# Altium integrated library Cap-Cer-SMD_V2.IntLib: 957 symbols (part 3 of 7) (continued)
## 10nF_0805N_50V_5%_C0G/NP0
designator C?, comment value 10nF  Voltage: 50V  Text1: 0805  (hidden comment: 10nF_C0805_50V_5%_C0G/NP0)
Cap Ceramic C0G/NP0; Manufacturer: Various; Part Number: 10nF 0805 50V 5% C0G/NP0; Tol: 5%; Package: CAPC0805X110N; EDM-PN: *; Text2: *; SAAB PN: *; DCE Part No: *
footprint CAPC0805X110N (Chip Capacitor, 0805, 2-Leads, Body 2.0x1.3mm, IPC Medium Density)
pins: 1, 2

## 10nF_0805N_50V_10%_X7R
designator C?, comment value 10nF  Voltage: 50V  Text1: 0805  (hidden comment: 10nF_C0805_50V_10%_X7R)
Cap Ceramic X7R; Manufacturer: Various; Part Number: 10nF 0805 50V 10% X7R; EDM-PN: CAP5; Tol: 10%; Package: CAPC0805X110N; Text2: *; SAAB PN: *; DCE Part No: *
footprint CAPC0805X110N (Chip Capacitor, 0805, 2-Leads, Body 2.0x1.3mm, IPC Medium Density)
pins: 1, 2

## 10nF_0805N_50V_10%_X7R-DNF
designator C?, comment value (10nF)  Voltage: 50V  Text1: 0805  (hidden comment: 10nF_C0805_50V_10%_X7R)
Cap Ceramic X7R - Do not Fit; Manufacturer: Various; Part Number: DNF - 10nF 0805 50V 10% X7R; EDM-PN: CAP5; Tol: 10%; Package: CAPC0805X110N; Text2: *; SAAB PN: *; DCE Part No: *
footprint CAPC0805X110N (Chip Capacitor, 0805, 2-Leads, Body 2.0x1.3mm, IPC Medium Density)
pins: 1, 2

## 10nF_0805N_100V_5%_C0G/NP0
designator C?, comment value 10nF  Voltage: 100V  Text1: 0805  (hidden comment: 10nF_C0805_100V_5%_C0G/NP0)
Cap Ceramic C0G/NP0; Manufacturer: Various; Part Number: 10nF 0805 100V 5% C0G/NP0; Tol: 5%; Package: CAPC0805X110N; EDM-PN: *; Text2: *; Reutech PN: *; SAAB PN: *; DCE Part No: *
footprint CAPC0805X110N (Chip Capacitor, 0805, 2-Leads, Body 2.0x1.3mm, IPC Medium Density)
pins: 1, 2

## 10nF_0805N_100V_10%_X7R
designator C?, comment value 10nF  Voltage: 100V  Text1: 0805  (hidden comment: 10nF_C0805_100V_10%_X7R)
Cap Ceramic X7R; Manufacturer: Various; Part Number: 10nF 0805 100V 10% X7R; EDM-PN: CAP994; Tol: 10%; Reutech PN: 5910-CA-0560; SAAB PN: 1AAB00129AEA; Package: CAPC0805X110N; Text2: *; DCE Part No: *
footprint CAPC0805X110N (Chip Capacitor, 0805, 2-Leads, Body 2.0x1.3mm, IPC Medium Density)
pins: 1, 2

## 10nF_0805N_250V_10%_X7R
designator C?, comment value 10nF  Voltage: 250V  Text1: 0805  (hidden comment: 10nF_C0805_250V_10%_X7R)
Cap Ceramic X7R; Manufacturer: Various; Part Number: 10nF 0805 250V 10% X7R; Tol: 10%; Package: CAPC0805X110N; EDM-PN: *; Text2: *; SAAB PN: *; DCE Part No: *
footprint CAPC0805X110N (Chip Capacitor, 0805, 2-Leads, Body 2.0x1.3mm, IPC Medium Density)
pins: 1, 2

## 10nF_0805N_500V_10%_X7R
designator C?, comment value 10nF  Voltage: 500V  Text1: 0805  (hidden comment: 10nF_C0805_500V_10%_X7R)
Cap Ceramic X7R; Manufacturer: Various; Part Number: 10nF 0805 500V 10% X7R; Tol: 10%; Package: CAPC0805X110N; EDM-PN: *; Text2: *; SAAB PN: *; DCE Part No: *
footprint CAPC0805X110N (Chip Capacitor, 0805, 2-Leads, Body 2.0x1.3mm, IPC Medium Density)
pins: 1, 2

## 10nF_1206N_50V_10%_X7R
designator C?, comment value 10nF  Voltage: 50V  Text1: 1206  (hidden comment: 10nF_C1206_50V_10%_X7R)
Cap Ceramic X7R; Manufacturer: Various; Part Number: 10nF 1206 50V 10% X7R; Tol: 10%; Package: CAPC1206X135N; EDM-PN: *; Text2: *; SAAB PN: *; DCE Part No: *
footprint CAPC1206X135N (Chip Capacitor, 1206, 2-Leads, Body 3.2x1.6mm, IPC Medium Density)
pins: 1, 2

## 10nF_1206N_500V_10%_X7R
designator C?, comment value 10nF  Voltage: 500V  Text1: 1206  (hidden comment: 10nF_C1206_500V_10%_X7R)
Cap Ceramic X7R; Manufacturer: Various; Part Number: 10nF 1206 500V 10% X7R; Tol: 10%; Package: CAPC1206X135N; EDM-PN: *; Text2: *; SAAB PN: *; DCE Part No: *
footprint CAPC1206X135N (Chip Capacitor, 1206, 2-Leads, Body 3.2x1.6mm, IPC Medium Density)
pins: 1, 2

## 10nF_1210N_1kV_10%_X7R
designator C?, comment value 10nF  Voltage: 1kV  Text1: 1210  (hidden comment: 10nF_C1210_1kV_10%_X7R)
Cap Ceramic X7R; Manufacturer: Various; Part Number: 10nF 1210 1kV 10% X7R; Tol: 10%; Package: CAPC1210X180N; EDM-PN: *; Text2: *; SAAB PN: *; DCE Part No: *
footprint CAPC1210X180N (Chip Capacitor, 1210, 2-Leads, Body 3.2x2.5mm, IPC Medium Density)
pins: 1, 2

## 10nF_1808N_500V_10%_X7R
designator C?, comment value 10nF  Voltage: 500V  Text1: 1808  (hidden comment: 10nF_C1808_500V_10%_X7R)
Cap Ceramic X7R; Manufacturer: Various; Part Number: 10nF 1808 500V 10% X7R; Tol: 10%; Package: CAPC1808X155N; EDM-PN: *; Text2: *; SAAB PN: *; DCE Part No: *
footprint CAPC1808X155N (Chip Capacitor, 1808, 2-Leads, Body 4.7x2.0mm, IPC Medium Density)
pins: 1, 2

## 10nF_1812N_1kV_10%_X7R
designator C?, comment value 10nF  Voltage: 1kV  Text1: 1812  (hidden comment: 10nF_C1812_1kV_10%_X7R)
Cap Ceramic X7R; Manufacturer: Various; Part Number: 10nF 1812 1kV 10% X7R; Tol: 10%; Package: CAPC1812X135N; EDM-PN: *; Text2: *; SAAB PN: *; DCE Part No: *
footprint CAPC1812X135N (Chip Capacitor, 1812, 2-Leads, Body 4.5x3.2mm, IPC Medium Density)
pins: 1, 2

## 10nF_1812N_500V_10%_X7R
designator C?, comment value 10nF  Voltage: 500V  Text1: 1812  (hidden comment: 10nF_C1812_500V_10%_X7R)
Cap Ceramic X7R; Manufacturer: Various; Part Number: 10nF 1812 500V 10% X7R; Tol: 10%; Package: CAPC1812X135N; EDM-PN: *; Text2: *; SAAB PN: *; DCE Part No: *
footprint CAPC1812X135N (Chip Capacitor, 1812, 2-Leads, Body 4.5x3.2mm, IPC Medium Density)
pins: 1, 2

## 10pF_0201N_25V_5%_C0G/NP0
designator C?, comment value 10pF  Voltage: 25V  Text1: 0201  (hidden comment: 10pF_C0201_25V_5%_C0G/NP0)
Cap Ceramic C0G/NP0; Manufacturer: Various; Part Number: 10pF 0201 25V 5%_C0G/NP0; Tol: 5%; Package: CAPC0201X33N; EDM-PN: *; Text2: *; SAAB PN: *; DCE Part No: *
footprint CAPC0201X33N (Chip Capacitor, 0201, 2-Leads, Body 0.6x0.3mm, IPC Medium Density)
pins: 1, 2

## 10pF_0201N_50V_5%_C0G/NP0
designator C?, comment value 10pF  Voltage: 50V  Text1: 0201  (hidden comment: 10pF_C0201_50V_5%_C0G/NP0)
Cap Ceramic C0G/NP0; Manufacturer: Various; Part Number: 10pF 0201 50V 5%_C0G/NP0; Tol: 5%; Package: CAPC0201X33N; EDM-PN: *; Text2: *; SAAB PN: *; DCE Part No: *
footprint CAPC0201X33N (Chip Capacitor, 0201, 2-Leads, Body 0.6x0.3mm, IPC Medium Density)
pins: 1, 2

## 10pF_0402L_50V_5%_C0G/NP0
designator C?, comment value 10pF  Voltage: 50V  Text1: 0402  (hidden comment: 10pF_C0402_50V_5%_C0G/NP0)
Cap Ceramic C0G/NP0; Manufacturer: Various; Part Number: 10pF 0402 50V 5% C0G/NP0; EDM-PN: CAP1008; Tol: 5%; Package: CAPC0402X60L; Text2: *; SAAB PN: *; DCE Part No: *
footprint CAPC0402X60L (Chip Capacitor, 0402, 2-Leads, Body 1.0x0.5mm, IPC High Density)
pins: 1, 2

## 10pF_0402N_50V_1%_C0G/NP0-GRM1555C
designator C?, comment value 10pF  Voltage: 50V  Text1: 0402  (hidden comment: GRM1555C1H100FA01D)
Cap Ceramic C0G/NP0; Manufacturer: Murata; Tol: 1%; Part Number: GRM1555C1H100FA01D; Package: GRM155-0.20; EDM-PN: *; Text2: *; SAAB PN: *; DCE Part No: *
footprint GRM155-0.20 (GRM155 0402 1.0x0.5mm)
pins: 1, 2

## 10pF_0402N_50V_5%_C0G/NP0
designator C?, comment value 10pF  Voltage: 50V  Text1: 0402  (hidden comment: 10pF_C0402_50V_5%_C0G/NP0)
Cap Ceramic C0G/NP0; Manufacturer: Various; Part Number: 10pF 0402 50V 5% C0G/NP0; EDM-PN: CAP1008; Tol: 5%; Package: CAPC0402X60N; Text2: *; SAAB PN: *; DCE Part No: *
footprint CAPC0402X60N (Chip Capacitor, 0402, 2-Leads, Body 1.0x0.5mm, IPC Medium Density)
pins: 1, 2

## 10pF_0402N_50V_10%_C0G/NP0
designator C?, comment value 10pF  Voltage: 50V  Text1: 0402  (hidden comment: 10pF_C0402_50V_10%_C0G/NP0)
Cap Ceramic C0G/NP0; Manufacturer: Various; Part Number: 10pF 0402 50V 10% C0G/NP0; DCE Part No: 7194; EDM-PN: CAP602; Tol: 10%; Package: CAPC0402X60N; Text2: *; SAAB PN: *
footprint CAPC0402X60N (Chip Capacitor, 0402, 2-Leads, Body 1.0x0.5mm, IPC Medium Density)
pins: 1, 2

## 10pF_0603N_50V_5%_C0G/NP0
designator C?, comment value 10pF  Voltage: 50V  Text1: 0603  (hidden comment: 10pF_C0603_50V_5%_C0G/NP0)
Cap Ceramic C0G/NP0; Manufacturer: Various; Part Number: 10pF 0603 50V 5% C0G/NP0; EDM-PN: CAP85; Tol: 5%; Package: CAPC0603X85N; Text2: *; SAAB PN: *; DCE Part No: *
footprint CAPC0603X85N (Chip Capacitor, 0603, 2-Leads, Body 1.6x0.8mm, IPC Medium Density)
pins: 1, 2

## 10pF_0603N_100V_5%_C0G/NP0
designator C?, comment value 10pF  Voltage: 100V  Text1: 0603  (hidden comment: 10pF_C0603_100V_5%_C0G/NP0)
Cap Ceramic C0G/NP0; Manufacturer: Various; Part Number: 10pF 0603 100V 5% C0G/NP0; Tol: 5%; Package: CAPC0603X85N; EDM-PN: *; Text2: *; SAAB PN: *; DCE Part No: *
footprint CAPC0603X85N (Chip Capacitor, 0603, 2-Leads, Body 1.6x0.8mm, IPC Medium Density)
pins: 1, 2

## 10pF_0805N_50V_5%_C0G/NP0
designator C?, comment value 10pF  Voltage: 50V  Text1: 0805  (hidden comment: 10pF_C0805_50V_5%_C0G/NP0)
Cap Ceramic C0G/NP0; Manufacturer: Various; Part Number: 10pF 0805 50V 5% C0G/NP0; Tol: 5%; Package: CAPC0805X110N; EDM-PN: *; Text2: *; SAAB PN: *; DCE Part No: *
footprint CAPC0805X110N (Chip Capacitor, 0805, 2-Leads, Body 2.0x1.3mm, IPC Medium Density)
pins: 1, 2

## 10pF_0805N_50V_5%_C0G/NP0-DNF
designator C?, comment value (10pF)  Voltage: 50V  Text1: 0805  (hidden comment: 10pF_C0805_50V_5%_C0G/NP0)
Cap Ceramic NP0 - Do not Fit; Manufacturer: Various; Part Number: DNF - 10pF 0805 50V 5% C0G/NP0; Tol: 5%; Package: CAPC0805X110N; EDM-PN: *; Text2: *; SAAB PN: *; DCE Part No: *
footprint CAPC0805X110N (Chip Capacitor, 0805, 2-Leads, Body 2.0x1.3mm, IPC Medium Density)
pins: 1, 2

## 10pF_0805N_100V_5%_C0G/NP0
designator C?, comment value 10pF  Voltage: 100V  Text1: 0805  (hidden comment: 10pF_C0805_100V_5%_C0G/NP0)
Cap Ceramic C0G/NP0; Manufacturer: Various; Part Number: 10pF 0805 100V 5% C0G/NP0; Tol: 5%; Package: CAPC0805X110N; EDM-PN: *; Text2: *; SAAB PN: *; DCE Part No: *
footprint CAPC0805X110N (Chip Capacitor, 0805, 2-Leads, Body 2.0x1.3mm, IPC Medium Density)
pins: 1, 2

## 10pF_0805N_630V_10%_X7R
designator C?, comment value 10pF  Voltage: 630V  Text1: 0805  (hidden comment: 10pF_C0805_630V_10%_X7R)
Cap Ceramic X7R; Manufacturer: Various; Part Number: 10pF 0805 630V 10% X7R; Tol: 10%; Package: CAPC0805X110N; EDM-PN: *; Text2: *; SAAB PN: *; DCE Part No: *
footprint CAPC0805X110N (Chip Capacitor, 0805, 2-Leads, Body 2.0x1.3mm, IPC Medium Density)
pins: 1, 2

## 10pF_0805N_630V_10%_X7R-DNF
designator C?, comment value (10pF)  Voltage: 630V  Text1: 0805  (hidden comment: 10pF_C0805_630V_10%_X7R-DNF)
Cap Ceramic X7R - Do not Fit; Manufacturer: Various; Part Number: DNF - 10pF 0805 630V 10% X7R; Tol: 10%; Package: CAPC0805X110N; EDM-PN: *; Text2: *; SAAB PN: *; DCE Part No: *
footprint CAPC0805X110N (Chip Capacitor, 0805, 2-Leads, Body 2.0x1.3mm, IPC Medium Density)
pins: 1, 2

## 10uF_0402N_6.3V_20%_X5R
designator C?, comment value 10uF  Voltage: 6.3V  Text1: 0402  (hidden comment: 10uF_C0402_6.3V_20%_X5R)
Cap Ceramic X5R; Manufacturer: Various; Part Number: 10uF 0402 6.3V 20% X5R; DCE Part No: 9490; Tol: 20%; Package: CAPC0402X60N; EDM-PN: *; Text2: *; SAAB PN: *
footprint CAPC0402X60N (Chip Capacitor, 0402, 2-Leads, Body 1.0x0.5mm, IPC Medium Density)
pins: 1, 2

## 10uF_0402N_10V_20%_X5R
designator C?, comment value 10uF  Voltage: 10V  Text1: 0402  (hidden comment: 10uF_C0402_10V_20%_X5R)
Cap Ceramic X5R; Manufacturer: Various; Part Number: 10uF 0402 10V 20% X5R; EDM-PN: CAP803; Tol: 20%; Package: CAPC0402X60N; Text2: *; SAAB PN: *; DCE Part No: *
footprint CAPC0402X60N (Chip Capacitor, 0402, 2-Leads, Body 1.0x0.5mm, IPC Medium Density)
pins: 1, 2

## 10uF_0603N_6.3V_10%_X5R
designator C?, comment value 10uF  Voltage: 6.3V  Text1: 0603  (hidden comment: 10uF_C0603_6.3V_10%_X5R)
Cap Ceramic X5R; Manufacturer: Various; Part Number: 10uF 0603 6.3V 10% X5R; EDM-PN: CAP605; Tol: 10%; Package: CAPC0603X85N; Text2: *; SAAB PN: *; DCE Part No: *
footprint CAPC0603X85N (Chip Capacitor, 0603, 2-Leads, Body 1.6x0.8mm, IPC Medium Density)
pins: 1, 2

## 10uF_0603N_6.3V_10%_X5R-GRM188
designator C?, comment value 10uF  Voltage: 6.3V  Text1: 0603  (hidden comment: 10uF_C0603_6.3V_10%_GRM188)
Cap Ceramic X5R; Manufacturer: Murata; Part Number: GRM188R60J106M; Tol: 10%; Package: CAPC0603X85N; EDM-PN: *; Text2: *; SAAB PN: *; DCE Part No: *
footprint CAPC0603X85N (Chip Capacitor, 0603, 2-Leads, Body 1.6x0.8mm, IPC Medium Density)
pins: 1, 2

## 10uF_0603N_6.3V_20%_X5R
designator C?, comment value 10uF  Voltage: 6.3V  Text1: 0603  (hidden comment: 10uF_C0603_6.3V_20%_X5R)
Cap Ceramic X5R; Manufacturer: Various; Part Number: 10uF 0603 6.3V 20% X5R; Tol: 20%; Package: CAPC0603X85N; EDM-PN: *; Text2: *; SAAB PN: *; DCE Part No: *
footprint CAPC0603X85N (Chip Capacitor, 0603, 2-Leads, Body 1.6x0.8mm, IPC Medium Density)
pins: 1, 2

## 10uF_0603N_6.3V_20%_X5R-GRM188R60J106ME47D
designator C?, comment value 10uF  Voltage: 6.3V  Text1: 0603  (hidden comment: GRM188R60J106ME47D)
Cap Ceramic X5R; Manufacturer: Murata; Tol: 20%; Part Number: GRM188R60J106ME47D; Package: CAPC0603X85N; EDM-PN: *; Text2: *; SAAB PN: *; DCE Part No: *
footprint CAPC0603X85N (Chip Capacitor, 0603, 2-Leads, Body 1.6x0.8mm, IPC Medium Density)
pins: 1, 2

## 10uF_0603N_10V_10%_X5R
designator C?, comment value 10uF  Voltage: 10V  Text1: 0603  (hidden comment: 10uF_C0603_10V_10%_X5R)
Cap Ceramic X5R; Manufacturer: Various; Part Number: 10uF 0603 10V 10% X5R; EDM-PN: CAP605; Tol: 10%; Reutech PN: 5910-CA-0521; Package: CAPC0603X85N; Text2: *; SAAB PN: *; DCE Part No: *
footprint CAPC0603X85N (Chip Capacitor, 0603, 2-Leads, Body 1.6x0.8mm, IPC Medium Density)
pins: 1, 2

## 10uF_0603N_16V_20%_X5R
designator C?, comment value 10uF  Voltage: 16V  Text1: 0603  (hidden comment: 10uF_C0603_16V_20%_X5R)
Cap Ceramic X5R; Manufacturer: Various; Part Number: 10uF 0603 16V 20% X5R; EDM-PN: CAP655; Tol: 20%; Package: CAPC0603X85N; Text2: *; SAAB PN: *; DCE Part No: *
footprint CAPC0603X85N (Chip Capacitor, 0603, 2-Leads, Body 1.6x0.8mm, IPC Medium Density)
pins: 1, 2

## 10uF_0603N_16V_20%_X5R-DNF
designator C?, comment value (10uF)  Voltage: 16V  Text1: 0603  (hidden comment: 10uF_C0603_16V_20%_X5R-DNF)
Cap Ceramic X5R - Do not Fit; Manufacturer: Various; Part Number: DNF - 10uF 0603 16V 16% X5R; Tol: 20%; Package: CAPC0603X85N; EDM-PN: *; Text2: *; SAAB PN: *; DCE Part No: *
footprint CAPC0603X85N (Chip Capacitor, 0603, 2-Leads, Body 1.6x0.8mm, IPC Medium Density)
pins: 1, 2

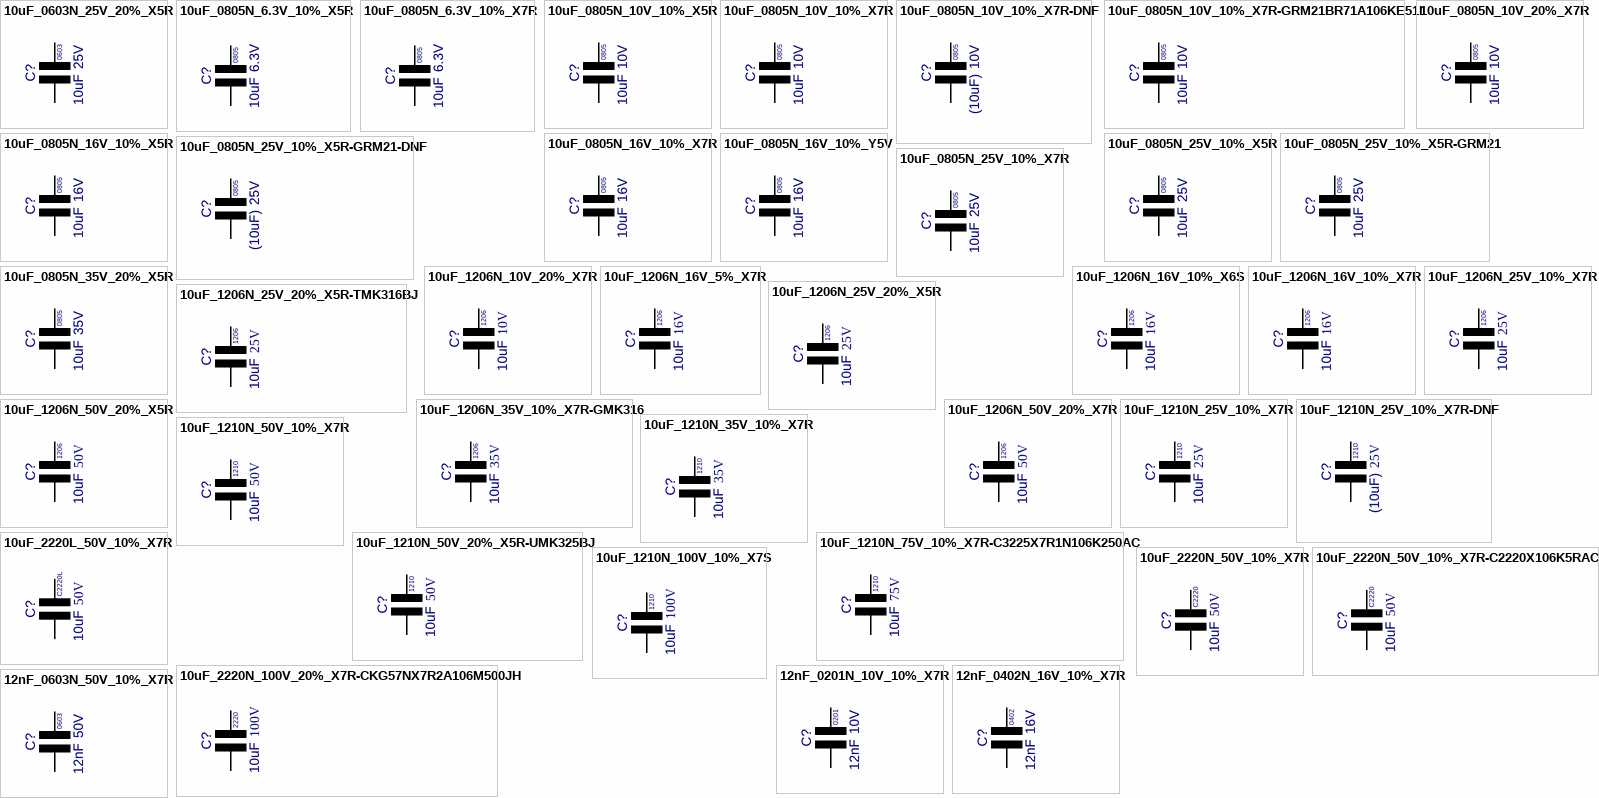
[diagram p10: symbols 10uF_0603N_25V_20%_X5R to 12nF_0603N_50V_10%_X7R]

## 10uF_0603N_25V_20%_X5R
designator C?, comment value 10uF  Voltage: 25V  Text1: 0603  (hidden comment: 10uF_C0603_25V_20%_X5R)
Cap Ceramic X5R; Manufacturer: Various; Part Number: 10uF 0603 25V 20% X5R; EDM-PN: CAP809; Tol: 20%; Package: CAPC0603X85N; Text2: *; SAAB PN: *; DCE Part No: *
footprint CAPC0603X85N (Chip Capacitor, 0603, 2-Leads, Body 1.6x0.8mm, IPC Medium Density)
pins: 1, 2

## 10uF_0805N_6.3V_10%_X5R
designator C?, comment value 10uF  Voltage: 6.3V  Text1: 0805  (hidden comment: 10uF_C0805_6.3V_10%_X5R)
Cap Ceramic X5R; Manufacturer: Various; Part Number: 10uF 0805 6.3V 10% X5R; Tol: 10%; Package: CAPC0805X110N; EDM-PN: *; Text2: *; SAAB PN: *; DCE Part No: *
footprint CAPC0805X110N (Chip Capacitor, 0805, 2-Leads, Body 2.0x1.3mm, IPC Medium Density)
pins: 1, 2

## 10uF_0805N_6.3V_10%_X7R
designator C?, comment value 10uF  Voltage: 6.3V  Text1: 0805  (hidden comment: 10uF_C0805_6.3V_10%_X7R)
Cap Ceramic X7R; Manufacturer: Various; Part Number: 10uF 0805 6.3V 10% X7R; Tol: 10%; Package: CAPC0805X110N; EDM-PN: *; Text2: *; SAAB PN: *; DCE Part No: *
footprint CAPC0805X110N (Chip Capacitor, 0805, 2-Leads, Body 2.0x1.3mm, IPC Medium Density)
pins: 1, 2

## 10uF_0805N_10V_10%_X5R
designator C?, comment value 10uF  Voltage: 10V  Text1: 0805  (hidden comment: 10uF_C0805_10V_10%_X5R)
Cap Ceramic X5R; Manufacturer: Various; Part Number: 10uF 0805 10V 10% X5R; EDM-PN: CAP302; Tol: 10%; Package: CAPC0805X110N; Text2: *; SAAB PN: *; DCE Part No: *
footprint CAPC0805X110N (Chip Capacitor, 0805, 2-Leads, Body 2.0x1.3mm, IPC Medium Density)
pins: 1, 2

## 10uF_0805N_10V_10%_X7R
designator C?, comment value 10uF  Voltage: 10V  Text1: 0805  (hidden comment: 10uF_C0805_10V_10%_X7R)
Cap Ceramic X7R; Manufacturer: Various; Part Number: 10uF 0805 10V 10% X7R; EDM-PN: CAP302; Tol: 10%; Package: CAPC0805X110N; Text2: *; SAAB PN: *; DCE Part No: *
footprint CAPC0805X110N (Chip Capacitor, 0805, 2-Leads, Body 2.0x1.3mm, IPC Medium Density)
pins: 1, 2

## 10uF_0805N_10V_10%_X7R-DNF
designator C?, comment value (10uF)  Voltage: 10V  Text1: 0805  (hidden comment: 10uF_C0805_10V_10%_X7R-DNF)
Cap Ceramic X7R - Do not Fit; Manufacturer: Various; Part Number: DNF - 10uF 0805 10V 10% X7R; EDM-PN: CAP302; Tol: 10%; Package: CAPC0805X110N; Text2: *; SAAB PN: *; DCE Part No: *
footprint CAPC0805X110N (Chip Capacitor, 0805, 2-Leads, Body 2.0x1.3mm, IPC Medium Density)
pins: 1, 2

## 10uF_0805N_10V_10%_X7R-GRM21BR71A106KE51L
designator C?, comment value 10uF  Voltage: 10V  Text1: 0805  (hidden comment: GRM21BR71A106KE51L)
Cap Ceramic X7R; Manufacturer: Murata; Tol: 10%; Part Number: GRM21BR71A106KE51L; Package: CAPC0805X110N; EDM-PN: *; Text2: *; SAAB PN: *; DCE Part No: *
footprint CAPC0805X110N (Chip Capacitor, 0805, 2-Leads, Body 2.0x1.3mm, IPC Medium Density)
pins: 1, 2

## 10uF_0805N_10V_20%_X7R
designator C?, comment value 10uF  Voltage: 10V  Text1: 0805  (hidden comment: 10uF_C0805_10V_20%_X7R)
Cap Ceramic X7R; Manufacturer: Various; Part Number: 10uF 0805 10V 20% X7R; EDM-PN: CAP302; Tol: 20%; Package: CAPC0805X110N; Text2: *; SAAB PN: *; DCE Part No: *
footprint CAPC0805X110N (Chip Capacitor, 0805, 2-Leads, Body 2.0x1.3mm, IPC Medium Density)
pins: 1, 2

## 10uF_0805N_16V_10%_X5R
designator C?, comment value 10uF  Voltage: 16V  Text1: 0805  (hidden comment: 10uF_C0805_16V_10%_X5R)
Cap Ceramic X5R; Manufacturer: Various; Part Number: 10uF 0805 16V 10% X5R; EDM-PN: CAP588; Tol: 10%; Package: CAPC0805X110N; Text2: *; SAAB PN: *; DCE Part No: *
footprint CAPC0805X110N (Chip Capacitor, 0805, 2-Leads, Body 2.0x1.3mm, IPC Medium Density)
pins: 1, 2

## 10uF_0805N_16V_10%_X7R
designator C?, comment value 10uF  Voltage: 16V  Text1: 0805  (hidden comment: 10uF_C0805_16V_10%_X7R)
Cap Ceramic X7R; Manufacturer: Various; Part Number: 10uF 0805 16V 10% X7R; Tol: 10%; Package: CAPC0805X110N; EDM-PN: *; Text2: *; SAAB PN: *; DCE Part No: *
footprint CAPC0805X110N (Chip Capacitor, 0805, 2-Leads, Body 2.0x1.3mm, IPC Medium Density)
pins: 1, 2

## 10uF_0805N_16V_10%_Y5V
designator C?, comment value 10uF  Voltage: 16V  Text1: 0805  (hidden comment: 10uF_C0805_16V_10%_Y5V)
Cap Ceramic Y5V; Manufacturer: Various; Part Number: 10uF 0805 16V 10% Y5V; EDM-PN: CAP588; Tol: 10%; Package: CAPC0805X135N; Text2: *; SAAB PN: *; DCE Part No: *
footprint CAPC0805X135N (Chip Capacitor, 0805, 2-Leads, Body 2.0x1.3mm, IPC Medium Density)
pins: 1, 2

## 10uF_0805N_25V_10%_X5R
designator C?, comment value 10uF  Voltage: 25V  Text1: 0805  (hidden comment: 10uF_C0805_25V_10%_X5R)
Cap Ceramic X5R; Manufacturer: Various; Part Number: 10uF 0805 25V 10% X5R; EDM-PN: CAP566; Tol: 10%; Package: CAPC0805X110N; Text2: *; SAAB PN: *; DCE Part No: *
footprint CAPC0805X110N (Chip Capacitor, 0805, 2-Leads, Body 2.0x1.3mm, IPC Medium Density)
pins: 1, 2

## 10uF_0805N_25V_10%_X5R-GRM21
designator C?, comment value 10uF  Voltage: 25V  Text1: 0805  (hidden comment: 10uF_C0805_25V_10%_X5R-GRM21)
Cap Ceramic X5R; Manufacturer: Murata; Part Number: GRM21BR61E106KA73L; EDM-PN: CAP566; Tol: 10%; Package: CAPC0805X135N; Text2: *; SAAB PN: *; DCE Part No: *
footprint CAPC0805X135N (Chip Capacitor, 0805, 2-Leads, Body 2.0x1.3mm, IPC Medium Density)
pins: 1, 2

## 10uF_0805N_25V_10%_X5R-GRM21-DNF
designator C?, comment value (10uF)  Voltage: 25V  Text1: 0805  (hidden comment: 10uF_C0805_25V_10%_X5R-GRM21)
Cap Ceramic X5R - Do not Fit; Manufacturer: Murata; Part Number: DNF - GRM21BR61E106KA73L; Tol: 10%; Package: CAPC0805X135N; EDM-PN: *; Text2: *; SAAB PN: *; DCE Part No: *
footprint CAPC0805X135N (Chip Capacitor, 0805, 2-Leads, Body 2.0x1.3mm, IPC Medium Density)
pins: 1, 2

## 10uF_0805N_25V_10%_X7R
designator C?, comment value 10uF  Voltage: 25V  Text1: 0805  (hidden comment: 10uF_C0805_25V_10%_X7R)
Cap Ceramic X7R; Manufacturer: Various; Part Number: 10uF 0805 25V 10% X7R; EDM-PN: CAP346; Tol: 10%; Package: CAPC0805X110N; Text2: *; SAAB PN: *; DCE Part No: *
footprint CAPC0805X110N (Chip Capacitor, 0805, 2-Leads, Body 2.0x1.3mm, IPC Medium Density)
pins: 1, 2

## 10uF_0805N_35V_20%_X5R
designator C?, comment value 10uF  Voltage: 35V  Text1: 0805  (hidden comment: 10uF_C0805_35V_20%_X5R)
Cap Ceramic X5R; Manufacturer: Various; Part Number: 10uF 0805 35V 20% X5R; Tol: 20%; Package: CAPC0805X110N; EDM-PN: *; Text2: *; SAAB PN: *; DCE Part No: *
footprint CAPC0805X110N (Chip Capacitor, 0805, 2-Leads, Body 2.0x1.3mm, IPC Medium Density)
pins: 1, 2

## 10uF_1206N_10V_20%_X7R
designator C?, comment value 10uF  Voltage: 10V  Text1: 1206  (hidden comment: 10uF_C1206_10V_20%_X7R)
Cap Ceramic X7R; Manufacturer: Various; Part Number: 10uF 1206 10V 20% X7R; Tol: 20%; Package: CAPC1206X135N; EDM-PN: *; Text2: *; SAAB PN: *; DCE Part No: *
footprint CAPC1206X135N (Chip Capacitor, 1206, 2-Leads, Body 3.2x1.6mm, IPC Medium Density)
pins: 1, 2

## 10uF_1206N_16V_5%_X7R
designator C?, comment value 10uF  Voltage: 16V  Text1: 1206  (hidden comment: 10uF_C1206_16V_5%_X7R)
Cap Ceramic X7R; Manufacturer: Various; Part Number: 10uF 1206 16V 5% X7R; Tol: 5%; Reutech PN: 5910-CA-0434; Package: CAPC1206X178N; EDM-PN: *; Text2: *; SAAB PN: *; DCE Part No: *
footprint CAPC1206X178N (Chip Capacitor, 1206, 2-Leads, Body 3.2x1.6mm, IPC Medium Density)
pins: 1, 2

## 10uF_1206N_16V_10%_X6S
designator C?, comment value 10uF  Voltage: 16V  Text1: 1206  (hidden comment: 10uF_C1206_16V_10%_X6S)
Cap Ceramic X6S; Manufacturer: Various; Part Number: 10uF 1206 16V 10% X6S; Tol: 10%; Package: CAPC1206X135N; EDM-PN: *; Text2: *; SAAB PN: *; DCE Part No: *
footprint CAPC1206X135N (Chip Capacitor, 1206, 2-Leads, Body 3.2x1.6mm, IPC Medium Density)
pins: 1, 2

## 10uF_1206N_16V_10%_X7R
designator C?, comment value 10uF  Voltage: 16V  Text1: 1206  (hidden comment: 10uF_C1206_16V_10%_X7R)
Cap Ceramic X7R; Manufacturer: Various; Part Number: 10uF 1206 16V 10% X7R; Tol: 10%; Package: CAPC1206X178N; EDM-PN: *; Text2: *; SAAB PN: *; DCE Part No: *
footprint CAPC1206X178N (Chip Capacitor, 1206, 2-Leads, Body 3.2x1.6mm, IPC Medium Density)
pins: 1, 2

## 10uF_1206N_25V_10%_X7R
designator C?, comment value 10uF  Voltage: 25V  Text1: 1206  (hidden comment: 10uF_C1206_25V_10%_X7R)
Cap Ceramic X7R; Manufacturer: Various; Part Number: 10uF 1206 25V 10% X7R; Tol: 10%; Package: CAPC1206X135N; EDM-PN: *; Text2: *; SAAB PN: *; DCE Part No: *
footprint CAPC1206X135N (Chip Capacitor, 1206, 2-Leads, Body 3.2x1.6mm, IPC Medium Density)
pins: 1, 2

## 10uF_1206N_25V_20%_X5R
designator C?, comment value 10uF  Voltage: 25V  Text1: 1206  (hidden comment: 10uF_C1206_25V_20%_X5R)
Cap Ceramic X5R; Manufacturer: Various; Part Number: 10uF 1206 25V 20% X5R; Tol: 20%; Package: CAPC1206X135N; EDM-PN: *; Text2: *; SAAB PN: *; DCE Part No: *
footprint CAPC1206X135N (Chip Capacitor, 1206, 2-Leads, Body 3.2x1.6mm, IPC Medium Density)
pins: 1, 2

## 10uF_1206N_25V_20%_X5R-TMK316BJ
designator C?, comment value 10uF  Voltage: 25V  Text1: 1206  (hidden comment: 10uF_C1206_25V_20%_X5R)
Cap Ceramic X5R; Manufacturer: Taiyo Yuden; Part Number: TMK316BJ106KL; Tol: 20%; Package: CAPC1206X135N; EDM-PN: *; Text2: *; SAAB PN: *; DCE Part No: *
footprint CAPC1206X178N (Chip Capacitor, 1206, 2-Leads, Body 3.2x1.6mm, IPC Medium Density)
pins: 1, 2

## 10uF_1206N_35V_10%_X7R-GMK316
designator C?, comment value 10uF  Voltage: 35V  Text1: 1206  (hidden comment: 10uF_C1206_35V_10%_X7R)
Cap Ceramic X7R; Manufacturer: Taiyo Yuden; Part Number: GMK316AB7106KL-TR; Tol: 10%; Package: CAPC1206X135N; EDM-PN: *; Text2: *; SAAB PN: *; DCE Part No: *
footprint CAPC1206X178N (Chip Capacitor, 1206, 2-Leads, Body 3.2x1.6mm, IPC Medium Density)
pins: 1, 2

## 10uF_1206N_50V_20%_X5R
designator C?, comment value 10uF  Voltage: 50V  Text1: 1206  (hidden comment: 10uF_C1206_50V_20%_X5R)
Cap Ceramic X5R; Manufacturer: Various; Part Number: 10uF 1206 50V 20% X5R; Tol: 20%; Package: CAPC1206X135N; EDM-PN: *; Text2: *; SAAB PN: *; DCE Part No: *
footprint CAPC1206X135N (Chip Capacitor, 1206, 2-Leads, Body 3.2x1.6mm, IPC Medium Density)
pins: 1, 2

## 10uF_1206N_50V_20%_X7R
designator C?, comment value 10uF  Voltage: 50V  Text1: 1206  (hidden comment: 10uF_C1206_50V_20%_X7R)
Cap Ceramic X7R; Manufacturer: Various; Part Number: 10uF 1206 50V 20% X7R; DCE Part No: 9317; Tol: 20%; Package: CAPC1206X135N; EDM-PN: *; Text2: *; SAAB PN: *
footprint CAPC1206X135N (Chip Capacitor, 1206, 2-Leads, Body 3.2x1.6mm, IPC Medium Density)
pins: 1, 2

## 10uF_1210N_25V_10%_X7R
designator C?, comment value 10uF  Voltage: 25V  Text1: 1210  (hidden comment: 10uF_C1210_25V_10%_X7R)
Cap Ceramic X7R; Manufacturer: Various; Part Number: 10uF 1210 25V 10% X7R; EDM-PN: CAP333; Tol: 10%; Package: CAPC1210X135N; Text2: *; SAAB PN: *; DCE Part No: *
footprint CAPC1210X135N (Chip Capacitor, 1210, 2-Leads, Body 3.2x2.5mm, IPC Medium Density)
pins: 1, 2

## 10uF_1210N_25V_10%_X7R-DNF
designator C?, comment value (10uF)  Voltage: 25V  Text1: 1210  (hidden comment: 10uF_C1210_25V_10%_X7R)
Cap Ceramic X7R - Do not Fit; Manufacturer: Various; Part Number: DNF - 10uF 1210 25V 10% X7R; EDM-PN: CAP333; Tol: 10%; Package: CAPC1210X135N; Text2: *; SAAB PN: *; DCE Part No: *
footprint CAPC1210X135N (Chip Capacitor, 1210, 2-Leads, Body 3.2x2.5mm, IPC Medium Density)
pins: 1, 2

## 10uF_1210N_35V_10%_X7R
designator C?, comment value 10uF  Voltage: 35V  Text1: 1210  (hidden comment: 10uF_C1210_35V_10%_X7R)
Cap Ceramic X7R; Manufacturer: Various; Part Number: 10uF 1210 35V 10% X7R; Tol: 10%; Package: CAPC1210X135N; EDM-PN: *; Text2: *; SAAB PN: *; DCE Part No: *
footprint CAPC1210X135N (Chip Capacitor, 1210, 2-Leads, Body 3.2x2.5mm, IPC Medium Density)
pins: 1, 2

## 10uF_1210N_50V_10%_X7R
designator C?, comment value 10uF  Voltage: 50V  Text1: 1210  (hidden comment: 10uF_C1210_50V_10%_X7R)
Cap Ceramic X7R; Manufacturer: Various; Part Number: 10uF 1210 50V 10% X7R; EDM-PN: CAP705; Tol: 10%; Package: CAPC1210X250N; Text2: *; SAAB PN: *; DCE Part No: *
footprint CAPC1210X250N (Chip Capacitor, 1210, 2-Leads, Body 3.2x2.5mm, IPC Medium Density)
pins: 1, 2

## 10uF_1210N_50V_20%_X5R-UMK325BJ
designator C?, comment value 10uF  Voltage: 50V  Text1: 1210  (hidden comment: 10uF_C1210_50V_20%_X5R)
Cap Ceramic X5R; Manufacturer: Taiyo Yuden; Part Number: UMK325BJ106MM; EDM-PN: CAP734; Tol: 20%; Package: CAPC1210X250N; Text2: *; SAAB PN: *; DCE Part No: *
footprint CAPC1210X250N (Chip Capacitor, 1210, 2-Leads, Body 3.2x2.5mm, IPC Medium Density)
pins: 1, 2

## 10uF_1210N_75V_10%_X7R-C3225X7R1N106K250AC
designator C?, comment value 10uF  Voltage: 75V  Text1: 1210  (hidden comment: C3225X7R1N106K250AC)
Cap Ceramic X7R; Manufacturer: TDK; Tol: 10%; Part Number: C3225X7R1N106K250AC; Package: CAPC1210X250N; EDM-PN: *; Text2: *; SAAB PN: *; DCE Part No: *
footprint CAPC1210X250N (Chip Capacitor, 1210, 2-Leads, Body 3.2x2.5mm, IPC Medium Density)
pins: 1, 2

## 10uF_1210N_100V_10%_X7S
designator C?, comment value 10uF  Voltage: 100V  Text1: 1210  (hidden comment: 10uF_C1210_100V_10%_X7S)
Cap Ceramic X7S; Manufacturer: Various; Part Number: 10uF 1210 100V 10% X7S; EDM-PN: CAP1427; Tol: 10%; Package: CAPC1210X250N; Text2: *; SAAB PN: *; DCE Part No: *
footprint CAPC1210X250N (Chip Capacitor, 1210, 2-Leads, Body 3.2x2.5mm, IPC Medium Density)
pins: 1, 2

## 10uF_2220L_50V_10%_X7R
designator C?, comment value 10uF  Text1: C2220L  Voltage: 50V  (hidden comment: 10uF_C2220L_50V_10%_X7R)
Cap Ceramic X7R; Manufacturer: Various; Part Number: 10uF C2220 50V 10% X7R; Tol: 10%; Reutech PN: 5910-CA-0419; Package: CAPC2220x280-L; EDM-PN: *; Text2: *; SAAB PN: *; DCE Part No: *
footprint CAPC2220x280-L (Chip Capacitor, 1825, 2-Leads, Body 5.6x5.0mm)
pins: 1, 2

## 10uF_2220N_50V_10%_X7R
designator C?, comment value 10uF  Text1: C2220  Voltage: 50V  (hidden comment: 10uF_C2220N_50V_10%_X7R)
Cap Ceramic X7R; Manufacturer: Various; Part Number: 10uF C2220 50V 10% X7R; Tol: 10%; Reutech PN: 5910-CA-0419; Package: CAPC2220x280; EDM-PN: *; Text2: *; SAAB PN: *; DCE Part No: *
footprint CAPC2220x280 (Chip Capacitor, 1825, 2-Leads, Body 5.6x5.0mm)
pins: 1, 2

## 10uF_2220N_50V_10%_X7R-C2220X106K5RACTU
designator C?, comment value 10uF  Text1: C2220  Voltage: 50V  (hidden comment: C2220X106K5RACTU)
Cap Ceramic X7R; Manufacturer: Kemet; Tol: 10%; Reutech PN: 5910-CA-0566; Part Number: C2220X106K5RACTU; Package: CAPC2220x280; EDM-PN: *; Text2: *; SAAB PN: *; DCE Part No: *
footprint CAPC2220x280 (Chip Capacitor, 1825, 2-Leads, Body 5.6x5.0mm)
pins: 1, 2

## 10uF_2220N_100V_20%_X7R-CKG57NX7R2A106M500JH
designator C?, comment value 10uF  Voltage: 100V  Text1: 2220  (hidden comment: CKG57NX7R2A106M500JH)
Cap Ceramic X7R Stacked; Manufacturer: TDK; Tol: 20%; Part Number: CKG57NX7R2A106M500JH; Package: CAPC2220-2Chip-5.5; EDM-PN: *; Text2: *; Reutech PN: *; SAAB PN: *; DCE Part No: *
footprint CAPC2220-2Chip-5.5 (Chip Capacitor, 2220, 2-Chips, 6.1x5.3mm)
pins: 1, 2

## 12nF_0201N_10V_10%_X7R
designator C?, comment value 12nF  Voltage: 10V  Text1: 0201  (hidden comment: 12nF_C0201_10V_10%_X7R)
Cap Ceramic X7R; Manufacturer: Various; Part Number: 12nF 0201 10V 10% X7R; Tol: 10%; Package: CAPC0201X33N; EDM-PN: *; Text2: *; SAAB PN: *; DCE Part No: *
footprint CAPC0201X33N (Chip Capacitor, 0201, 2-Leads, Body 0.6x0.3mm, IPC Medium Density)
pins: 1, 2

## 12nF_0402N_16V_10%_X7R
designator C?, comment value 12nF  Voltage: 16V  Text1: 0402  (hidden comment: 12nF_C0402_16V_10%_X7R)
Cap Ceramic X7R; Manufacturer: Various; Part Number: 12nF 0402 16V 10% X7R; Tol: 10%; Package: CAPC0402X60N; EDM-PN: *; Text2: *; SAAB PN: *; DCE Part No: *
footprint CAPC0402X60N (Chip Capacitor, 0402, 2-Leads, Body 1.0x0.5mm, IPC Medium Density)
pins: 1, 2

## 12nF_0603N_50V_10%_X7R
designator C?, comment value 12nF  Voltage: 50V  Text1: 0603  (hidden comment: 12nF_C0603_50V_10%_X7R)
Cap Ceramic X7R; Manufacturer: Various; Part Number: 12nF 0603 50V 10% X7R; Tol: 10%; Package: CAPC0603X85N; EDM-PN: *; Text2: *; SAAB PN: *; DCE Part No: *
footprint CAPC0603X85N (Chip Capacitor, 0603, 2-Leads, Body 1.6x0.8mm, IPC Medium Density)
pins: 1, 2

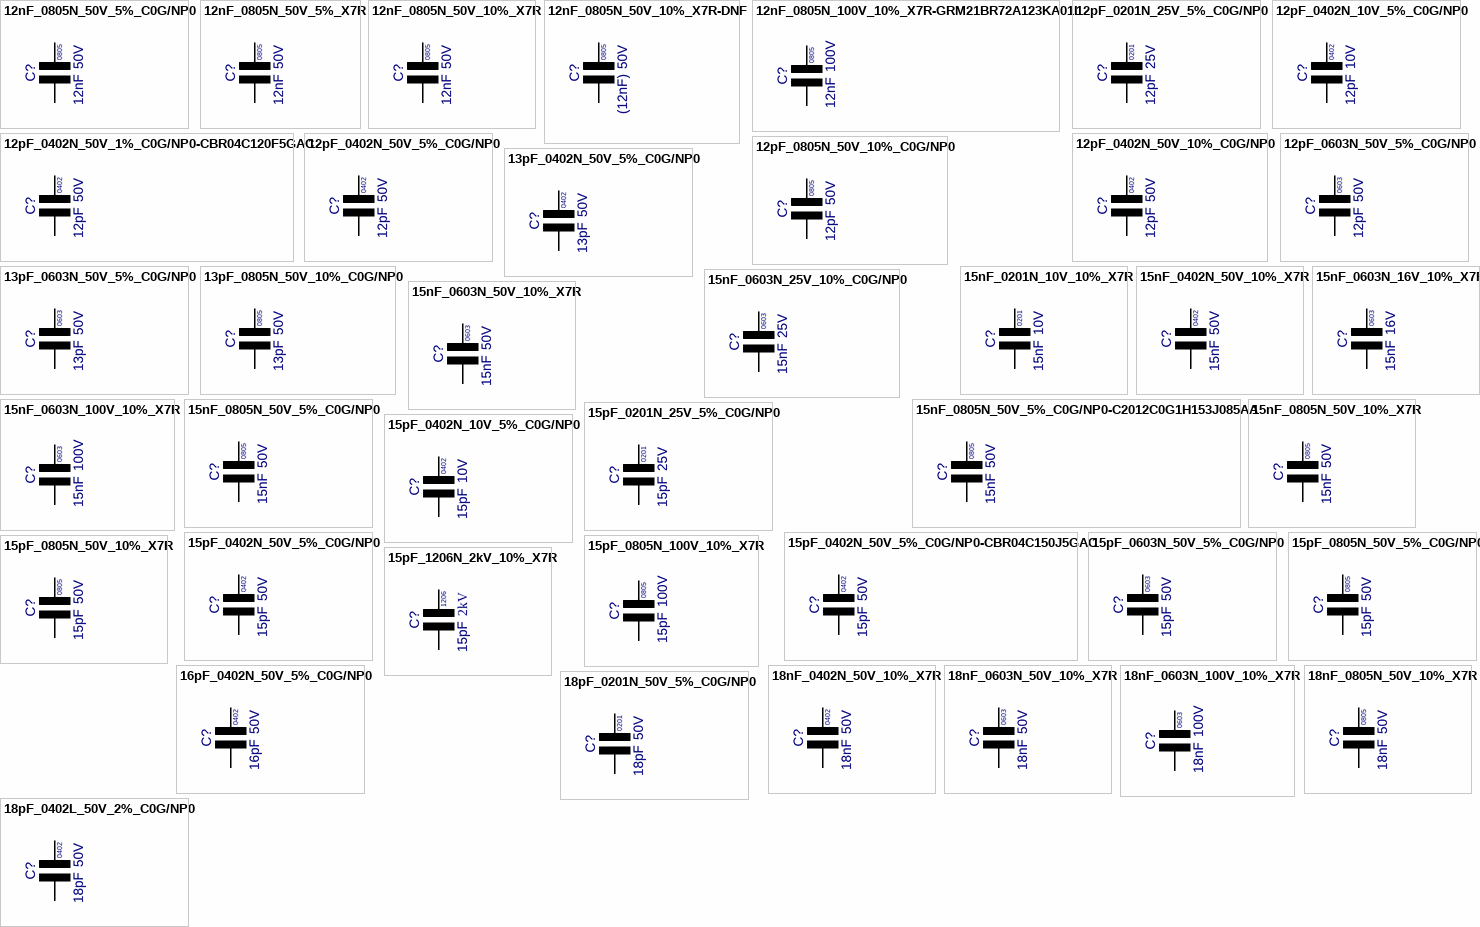
[diagram p11: symbols 12nF_0805N_50V_5%_C0G/NP0 to 18pF_0402L_50V_2%_C0G/NP0]

## 12nF_0805N_50V_5%_C0G/NP0
designator C?, comment value 12nF  Voltage: 50V  Text1: 0805  (hidden comment: 12nF_C0805_50V_5%_C0G/NP0)
Cap Ceramic C0G/NP0; Manufacturer: Various; Part Number: 12nF 0805 50V 5% C0G/NP0; Tol: 5%; Package: CAPC0805X110N; EDM-PN: *; Text2: *; SAAB PN: *; DCE Part No: *
footprint CAPC0805X110N (Chip Capacitor, 0805, 2-Leads, Body 2.0x1.3mm, IPC Medium Density)
pins: 1, 2

## 12nF_0805N_50V_5%_X7R
designator C?, comment value 12nF  Voltage: 50V  Text1: 0805  (hidden comment: 12nF_C0805_50V_5%_X7R)
Cap Ceramic X7R; Manufacturer: Various; Part Number: 12nF 0805 50V 5% X7R; Tol: 5%; Package: CAPC0805X110N; EDM-PN: *; Text2: *; SAAB PN: *; DCE Part No: *
footprint CAPC0805X110N (Chip Capacitor, 0805, 2-Leads, Body 2.0x1.3mm, IPC Medium Density)
pins: 1, 2

## 12nF_0805N_50V_10%_X7R
designator C?, comment value 12nF  Voltage: 50V  Text1: 0805  (hidden comment: 12nF_C0805_50V_10%_X7R)
Cap Ceramic X7R; Manufacturer: Various; Part Number: 12nF 0805 50V 10% X7R; Tol: 10%; Package: CAPC0805X110N; EDM-PN: *; Text2: *; SAAB PN: *; DCE Part No: *
footprint CAPC0805X110N (Chip Capacitor, 0805, 2-Leads, Body 2.0x1.3mm, IPC Medium Density)
pins: 1, 2

## 12nF_0805N_50V_10%_X7R-DNF
designator C?, comment value (12nF)  Voltage: 50V  Text1: 0805  (hidden comment: 12nF_C0805_50V_10%_X7R-DNF)
Cap Ceramic X7R - Do not Fit; Manufacturer: Various; Part Number: DNF - 12nF 0805 50V 10% X7R; Tol: 10%; Package: CAPC0805X110N; EDM-PN: *; Text2: *; SAAB PN: *; DCE Part No: *
footprint CAPC0805X110N (Chip Capacitor, 0805, 2-Leads, Body 2.0x1.3mm, IPC Medium Density)
pins: 1, 2

## 12nF_0805N_100V_10%_X7R-GRM21BR72A123KA01L
designator C?, comment value 12nF  Voltage: 100V  Text1: 0805  (hidden comment: 12nF_C0805_100V_10%_X7R)
Cap Ceramic X7R; Manufacturer: Murata; Part Number: GRM21BR72A123KA01L; Tol: 10%; Package: CAPC0805X110N; EDM-PN: *; Text2: *; SAAB PN: *; DCE Part No: *
footprint CAPC0805X110N (Chip Capacitor, 0805, 2-Leads, Body 2.0x1.3mm, IPC Medium Density)
pins: 1, 2